# Altium footprint library lib_protel_HC_BOINA.PCBLIB: 726 footprints (part 8 of 46)
Each footprint in its own frame and in the unit in brackets; x right, y up, seen from the top. Pads: shape width x height; smd on the part's side, far side on the other; paste and mask are expansions set on the pad; w line width, h text height; cw(c..) or ccw(c..) is an arc to the next point about the centre after c.
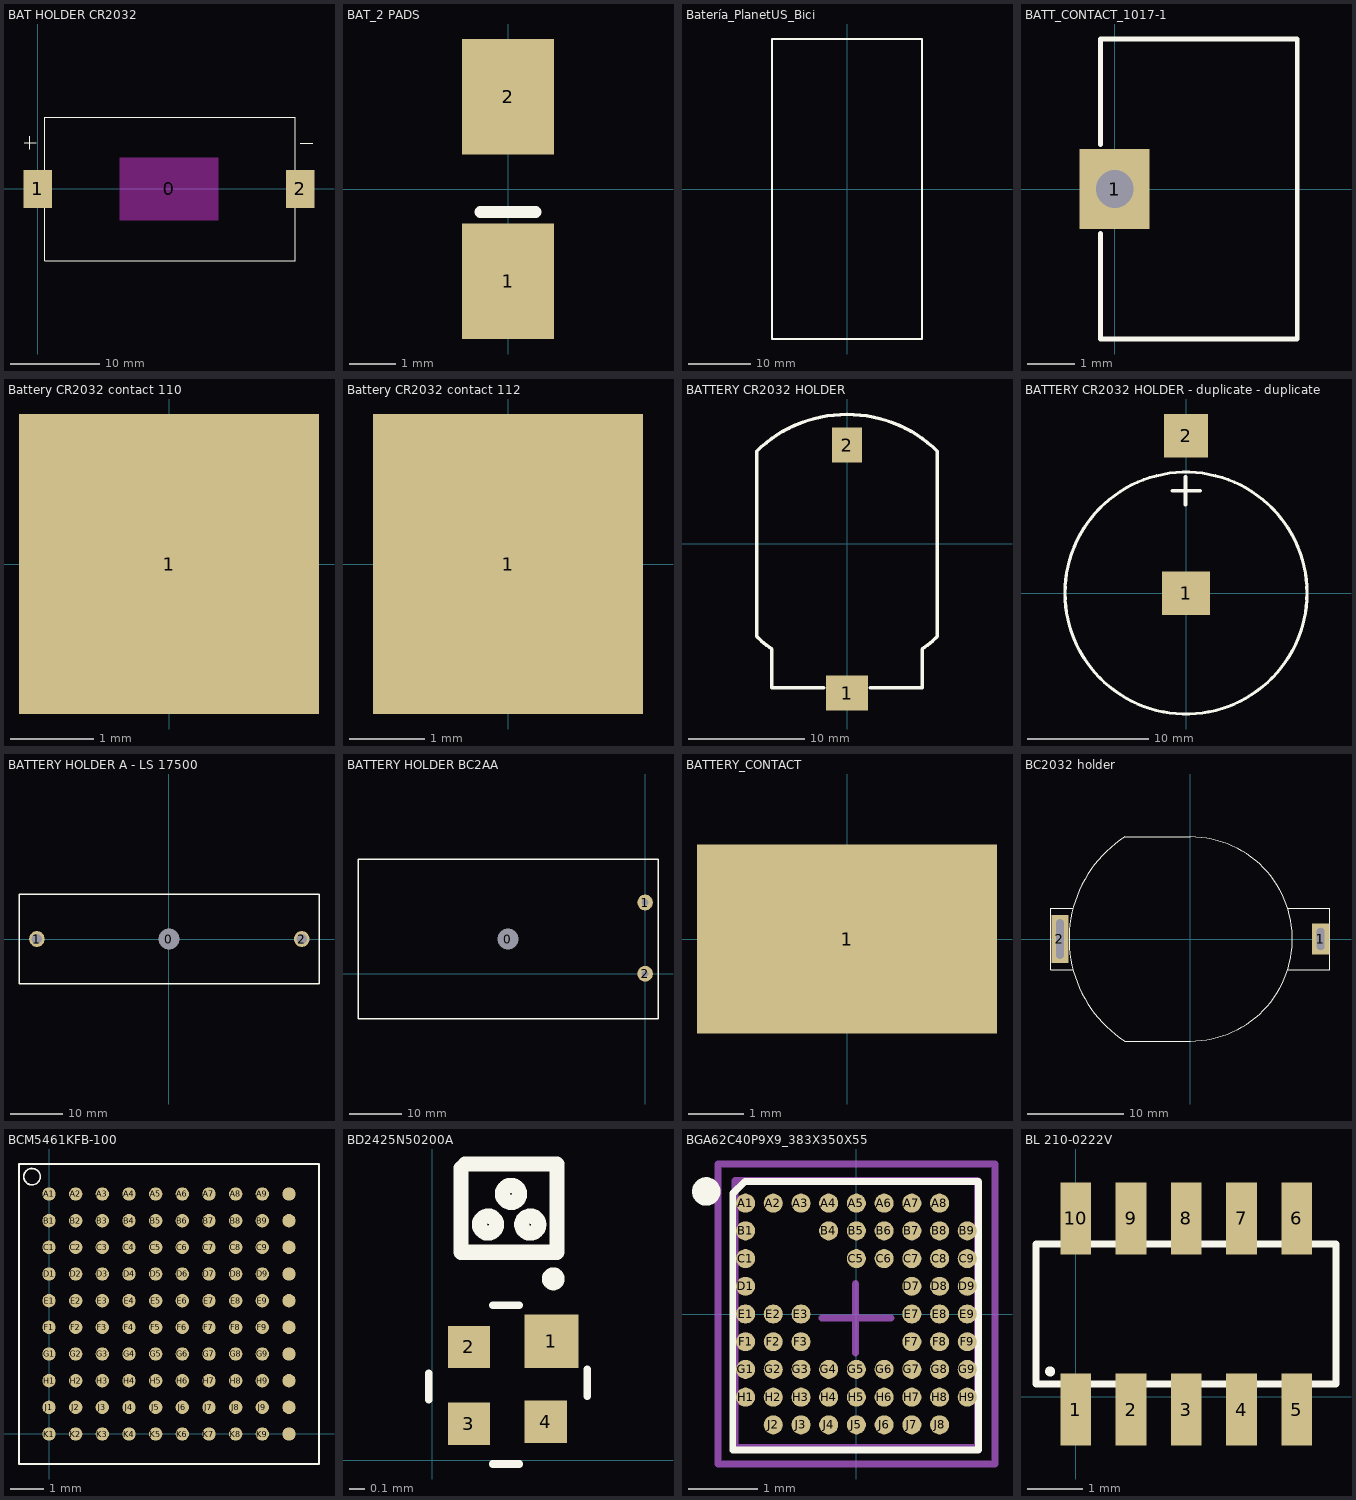
[diagram p7: the footprints below, top view; thin cyan lines are the x and y axes]

## BAT HOLDER CR2032 [mm] "BATTERY HOLDER FOR CR2032"
height 5.2
pads (3):
  rect 11x7 on Keep-Out: 0(14.65,0)
  rect 3.2x4.2 smd: 1(0,0) 2(29.3,0)
Top Overlay:
  lines w0.1: -1.5,5.15 -0.175,5.15 ; -0.875,4.425 -0.875,5.875 ; 29.325,5.1 30.725,5.1 ; 0.75,-8 0.75,8 28.75,8 28.75,-8 0.75,-8

## BAT_2 PADS [mm] "TERMIANL BLOCK 2 VIAS"
height 16.5
pads (2):
  rect 2x2.5 smd: 1(0,-2) 2(0,2)
Top Overlay:
  lines w0.254: -0.6,-0.5 0.6,-0.5

## Batería_PlanetUS_Bici [mm]
height 8.5
Top Overlay:
  lines w0.3: -12,-24 12,-24 12,24 -12,24 -12,-24
3D body: height 8.5, standoff 0, extent -12,-24 12,24

## BATT_CONTACT_1017-1 [mm]
pads (1):
  rect 1.5x1.7 hole 0.8 square: 1(0,0)
Top Overlay:
  lines w0.1: -0.3,-0.95 -0.3,-3.2 3.9,-3.2 3.9,3.2 -0.3,3.2 -0.3,0.95
3D body "Keystone1017-1.STEP": height 13.84, standoff -4.32, extent -0.141,-3.166 3.808,3.184

## Battery CR2032 contact 110 [mm]
height 3.17
pads (1):
  rect 3.6x3.6 smd: 1(0,0)
3D body "keystone-PN110TR.STEP": height 3.02, standoff -0.15, extent -1.739,-1.753 3.57,1.753

## Battery CR2032 contact 112 [mm]
height 0.25
pads (1):
  rect 3.6x4 smd: 1(0,0)
3D body "keystone-PN112.STEP": height 1.02, standoff 0, extent -4.924,-1.981 4.924,1.981

## BATTERY CR2032 HOLDER [mm] "Harwin S8421-45R"
height 5.4
pads (2):
  rect 3.6x3 smd: 1(0,-12.9)
  rect 2.6x3 smd: 2(0,8.5)
Top Overlay:
  lines w0.3: -7.802,-8.008 ccw(c0,0) -6.5,-9.097 -6.5,-12.44 -2,-12.44 ; -7.8,-8.005 -7.8,7.968 cw(c0,0) 7.8,7.968 7.8,-8.005 ; 2,-12.44 6.5,-12.44 6.5,-9.097 ccw(c0,0) 7.802,-8.008
3D body "User Library-CR2032_Holder.STEP": height 5.6, standoff 0, extent -8,-16.5 8,15.7

## BATTERY CR2032 HOLDER - duplicate - duplicate [mm]
pads (2):
  rect 4x3.6 smd: 1(0,0)
  rect 3.6x3.6 smd: 2(0,13)
Top Overlay:
  circle w0.254: c0,0 r10
  lines w0.3: -1.14,8.46 1.16,8.46 ; -0.04,7.31 -0.04,9.61
3D body "keystone-PN110TR.STEP": height 3.02, standoff -0.15, extent -1.753,9.43 1.753,14.739
3D body "keystone-PN112.STEP": height 1.02, standoff 0, extent -1.981,-4.924 1.981,4.924

## BATTERY HOLDER A - LS 17500 [mm] "SOPORTE 1 BATERÍA A"
pads (3):
  round 3 hole 4: 0(0,0)
  round 3 hole 2: 1(-25.168,0) 2(25.332,0)
Top Overlay:
  lines w0.254: -28.581,-8.5 -28.581,8.5 28.619,8.5 28.619,-8.5 -28.581,-8.5
3D body "AA Battery.STEP": height 17.35, standoff -1, extent -27.59,-7.525 27.66,7.175

## BATTERY HOLDER BC2AA [mm] "SOPORTE 2 BATERÍAS AA EN PCB"
height 15
pads (3):
  round 3 hole 4: 0(-26.16,6.63)
  round 3 hole 1.3: 1(0,13.59) 2(0,0)
Top Overlay:
  lines w0.254: -54.741,-8.619 -54.741,21.881 2.459,21.881 2.459,-8.619 -54.741,-8.619
3D body "User Library-HH-3632_4upload.STEP": height 15.04, standoff 0.02, extent -54.9,-8.991 2.7,22.2

## BATTERY_CONTACT [mm]
pads (1):
  rect 5.4x3.4 smd: 1(0,0)
3D body "keystone-PN110TR.STEP": height 3.17, standoff 0, extent -1.719,-3.611 1.786,1.697

## BC2032 holder [mm]
pads (2):
  rect 1.8x3.2 hole 0.8 slot 2.3 at 90 deg: 1(13.6,0)
  rect 1.8x5 hole 0.8 slot 4.1 at 90 deg: 2(-13.6,0)
Top Overlay:
  lines w0.1: -12.25,-3.2 -14.55,-3.2 -14.55,3.2 -12.25,3.2 ; 10.2,-3.2 14.55,-3.2 14.55,3.2 10.2,3.2 ; -6.826,-10.65 cw(c0,0) -6.826,10.65 0,10.65 cw(c0,0) 0,-10.65 -6.826,-10.65

## BCM5461KFB-100 [mm] "BCM5461KFB"
height 1.7
pads (100):
  round 0.4 smd mask+0.025: A1(0,7.2) A2(0.8,7.2) A3(1.6,7.2) A4(2.4,7.2) A5(3.2,7.2) A6(4,7.2) A7(4.8,7.2) A8(5.6,7.2) A9(6.4,7.2) A10(7.2,7.2) B1(0,6.4) B2(0.8,6.4) B3(1.6,6.4) B4(2.4,6.4) B5(3.2,6.4) B6(4,6.4) B7(4.8,6.4) B8(5.6,6.4) B9(6.4,6.4) B10(7.2,6.4) C1(0,5.6) C2(0.8,5.6) C3(1.6,5.6) C4(2.4,5.6) C5(3.2,5.6) C6(4,5.6) C7(4.8,5.6) C8(5.6,5.6) C9(6.4,5.6) C10(7.2,5.6) D1(0,4.8) D2(0.8,4.8) D3(1.6,4.8) D4(2.4,4.8) D5(3.2,4.8) D6(4,4.8) D7(4.8,4.8) D8(5.6,4.8) D9(6.4,4.8) D10(7.2,4.8) E1(0,4) E2(0.8,4) E3(1.6,4) E4(2.4,4) E5(3.2,4) E6(4,4) E7(4.8,4) E8(5.6,4) E9(6.4,4) E10(7.2,4) F1(0,3.2) F2(0.8,3.2) F3(1.6,3.2) F4(2.4,3.2) F5(3.2,3.2) F6(4,3.2) F7(4.8,3.2) F8(5.6,3.2) F9(6.4,3.2) F10(7.2,3.2) G1(0,2.4) G2(0.8,2.4) G3(1.6,2.4) G4(2.4,2.4) G5(3.2,2.4) G6(4,2.4) G7(4.8,2.4) G8(5.6,2.4) G9(6.4,2.4) G10(7.2,2.4) H1(0,1.6) H2(0.8,1.6) H3(1.6,1.6) H4(2.4,1.6) H5(3.2,1.6) H6(4,1.6) H7(4.8,1.6) H8(5.6,1.6) H9(6.4,1.6) H10(7.2,1.6) J1(0,0.8) J2(0.8,0.8) J3(1.6,0.8) J4(2.4,0.8) J5(3.2,0.8) J6(4,0.8) J7(4.8,0.8) J8(5.6,0.8) J9(6.4,0.8) J10(7.2,0.8) K1(0,0) K2(0.8,0) K3(1.6,0) K4(2.4,0) K5(3.2,0) K6(4,0) K7(4.8,0) K8(5.6,0) K9(6.4,0) K10(7.2,0)
Top Overlay:
  circle w0.051: c-0.51,7.72 r0.247
  lines w0.051: -0.9,-0.9 8.1,-0.9 8.1,8.1 -0.9,8.1 -0.9,-0.9

## BD2425N50200A [mil] "BALUN 2.4GHZ"
height 25.59
pads (4):
  rect 14x14 smd mask+4: 1(31,31)
  rect 11x11 smd mask+4: 2(9.5,29.5) 3(9.5,9.5) 4(29.5,10)
Top Overlay:
  circle w3.94: c25.48,61.39 r2.23
  circle w3.94: c14.48,61.39 r2.23
  circle w3.94: c20.48,69.39 r2.23
  circle w3.94: c31.48,47.24 r1
  lines w2: -0.98,15.75 -0.98,22.64 ; 15.75,-0.98 22.64,-0.98 ; 15.75,40.35 22.64,40.35 ; 40.35,16.73 40.35,23.62
  lines w3.94: 7.48,76.17 7.48,54.17 32.48,54.17 32.48,76.17 ; 8.48,77.17 32.48,77.17

## BGA62C40P9X9_383X350X55 [mm] "nRF51822 WLCSP"
pads (62):
  round 0.275 smd mask+0.035: A1(-1.6,1.6) A2(-1.2,1.6) A3(-0.8,1.6) A4(-0.4,1.6) A5(0,1.6) A6(0.4,1.6) A7(0.8,1.6) A8(1.2,1.6) B1(-1.6,1.2) B4(-0.4,1.2) B5(0,1.2) B6(0.4,1.2) B7(0.8,1.2) B8(1.2,1.2) B9(1.6,1.2) C1(-1.6,0.8) C5(0,0.8) C6(0.4,0.8) C7(0.8,0.8) C8(1.2,0.8) C9(1.6,0.8) D1(-1.6,0.4) D7(0.8,0.4) D8(1.2,0.4) D9(1.6,0.4) E1(-1.6,0) E2(-1.2,0) E3(-0.8,0) E7(0.8,0) E8(1.2,0) E9(1.6,0) F1(-1.6,-0.4) F2(-1.2,-0.4) F3(-0.8,-0.4) F7(0.8,-0.4) F8(1.2,-0.4) F9(1.6,-0.4) G1(-1.6,-0.8) G2(-1.2,-0.8) G3(-0.8,-0.8) G4(-0.4,-0.8) G5(0,-0.8) G6(0.4,-0.8) G7(0.8,-0.8) G8(1.2,-0.8) G9(1.6,-0.8) H1(-1.6,-1.2) H2(-1.2,-1.2) H3(-0.8,-1.2) H4(-0.4,-1.2) H5(0,-1.2) H6(0.4,-1.2) H7(0.8,-1.2) H8(1.2,-1.2) H9(1.6,-1.2) J2(-1.2,-1.6) J3(-0.8,-1.6) J4(-0.4,-1.6) J5(0,-1.6) J6(0.4,-1.6) J7(0.8,-1.6) J8(1.2,-1.6)
Top Overlay:
  circle w0.2: c-2.166,1.769 r0.105
  lines w0.1: -1.785,-1.965 -1.785,1.74 -1.61,1.915 1.765,1.915 1.765,-1.965 -1.785,-1.965
Mechanical 13:
  lines w0.1: -1.75,-1.925 1.75,-1.925 1.75,1.925 -1.75,1.925 -1.75,-1.925
Mechanical 15:
  lines w0.1: -0.5,-0.06 0.5,-0.06 ; -0.01,-0.56 -0.01,0.44 ; -2,-2.165 2,-2.165 2,2.165 -2,2.165 -2,-2.165
3D body: height 0.5, standoff 0, extent -1.785,-1.965 1.765,1.915
3D body: height 0.51, standoff 0.5, extent -1.496,1.297 -1.297,1.497

## BL 210-0222V [mm]
pads (10):
  rect 0.56x1.3 smd: 1(0,-0.23) 2(1,-0.23) 3(2,-0.23) 4(3,-0.23) 5(4,-0.23) 6(4,3.23) 7(3,3.23) 8(2,3.23) 9(1,3.23) 10(0,3.23)
Top Overlay:
  circle w0.127: c-0.465,0.46 r0.028
  lines w0.127: -0.72,0.23 -0.72,2.77 4.71,2.77 4.71,0.23 -0.72,0.23